# Altium footprint library Stargazer PCB.PcbLib: 32 footprints (part 1 of 2)
Each footprint in its own frame and in the unit in brackets; x right, y up, seen from the top. Pads: shape width x height; smd on the part's side, far side on the other; paste and mask are expansions set on the pad; w line width, h text height; cw(c..) or ccw(c..) is an arc to the next point about the centre after c.
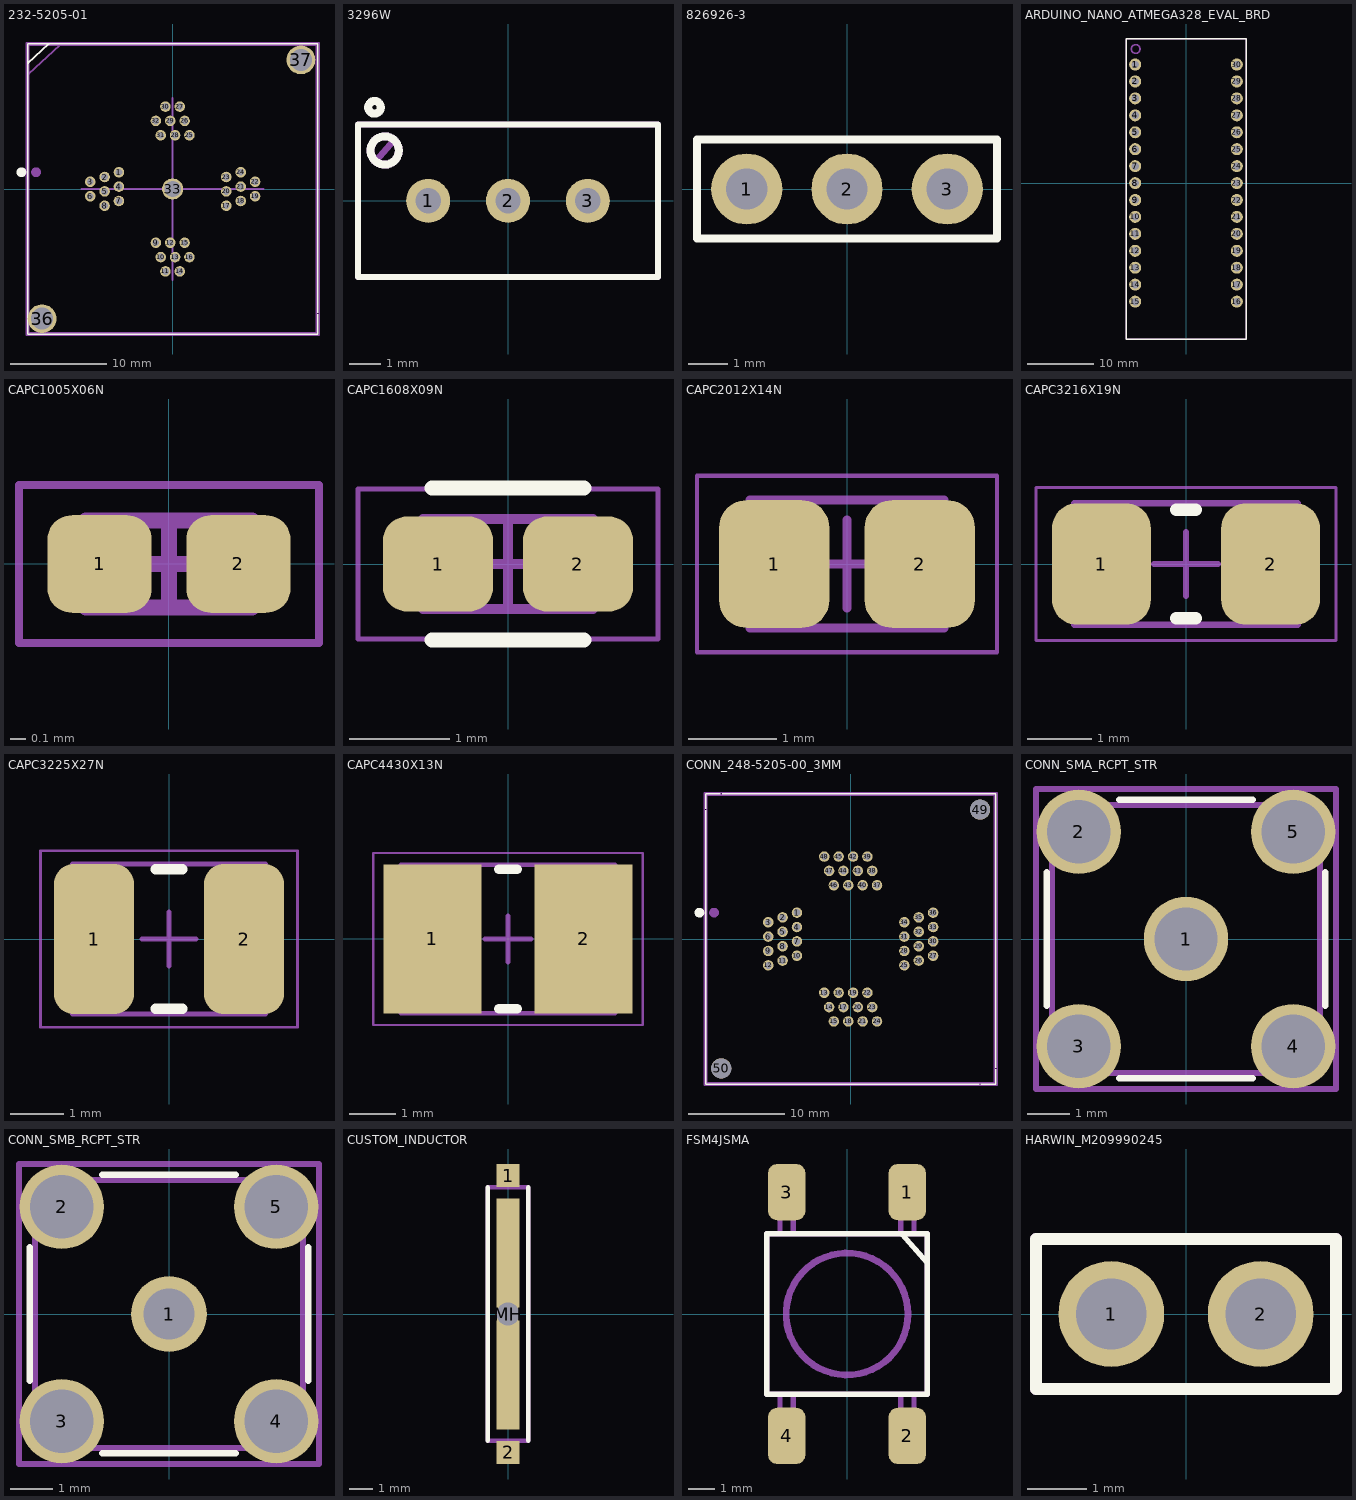
[diagram p0: the footprints below, top view; thin cyan lines are the x and y axes]

## 232-5205-01 [mm]
height 1.75
pads (35):
  round 1.1 hole 0.7 paste-2539.97: 1(-5.6,1.751) 2(-7.1,1.251) 3(-8.6,0.751) 4(-5.6,0.25) 5(-7.1,-0.25) 6(-8.6,-0.751) 7(-5.6,-1.251) 8(-7.1,-1.751) 9(-1.751,-5.6) 10(-1.251,-7.1) 11(-0.751,-8.6) 12(-0.25,-5.6) 13(0.25,-7.1) 14(0.751,-8.6) 15(1.251,-5.6) 16(1.751,-7.1) 17(5.6,-1.751) 18(7.1,-1.251) 19(8.6,-0.751) 20(5.6,-0.25) 21(7.1,0.25) 22(8.6,0.751) 23(5.6,1.251) 24(7.1,1.751) 25(1.751,5.6) 26(1.251,7.1) 27(0.751,8.6) 28(0.25,5.6) 29(-0.25,7.1) 30(-0.751,8.6) 31(-1.251,5.6) 32(-1.751,7.1)
  round 2.2 hole 1.7 paste-2539.97: 33(0,0)
  round 3 hole 2.3 paste-2539.97: 36(-13.622,-13.53) 37(13.378,13.47)
Top Overlay:
  circle w0.508: c-15.773,1.751 r0.254
  lines w0.15: -13.089,15.138 -12.911,15.138
  lines w0.152: -13.089,15.138 -15.138,15.138 -15.138,-15.138 15.138,-15.138 15.138,-13.089 ; -12.911,15.138 15.138,15.138 15.138,-12.911
  lines w0.2: -15.1,13.1 -12.911,15.138
Mechanical 13:
  circle w0.508: c-14.249,1.751 r0.254
  lines w0.2: -15,12 -11.8,15 ; -15.011,-15.011 15.011,-15.011 15.011,15.011 -15.011,15.011 -15.011,-15.011
  text ".Designator" at -6.7,-12.253 h3
Mechanical 15:
  lines w0.152: -15.265,-15.265 15.265,-15.265 15.265,15.265 -15.265,15.265 -15.265,-15.265
  lines w0.2: -9.5,0 0,0 ; 0,-9.5 0,0 ; 0,9.5 0,0 ; 9.5,0 0,0
3D body "232-5205-01_step.stp": height 16.75, standoff -5.15, extent -15,-15 15,15

## 3296W [mm]
height 1.75
pads (3):
  round 1.4 hole 0.8: 1(-2.54,0) 2(0,0) 3(2.54,0)
Top Overlay:
  circle w0.254: c-3.925,1.6 r0.451
  lines w0.2: -4.775,-2.425 4.775,-2.425 4.775,2.425 -4.775,2.425 -4.775,-2.425
  lines w0.254: -4.053,3.008 ccw(c-4.25,2.975) -4.05,2.975
Mechanical 13:
  circle w0.254: c-3.925,1.6 r0.45
  lines w0.2: -4.2,1.275 -3.625,1.925 ; -4.775,-2.425 4.775,-2.425 4.775,2.425 -4.775,2.425 -4.775,-2.425
  text ".Designator" at -4.05,-1.727 h2
3D body "3296W-1-203LF.step": height 11.55, standoff -7.72, extent -4.765,-2.41 4.765,2.42

## 826926-3 [mm]
height 1.75
pads (3):
  round 1.8 hole 1.05 paste-2539.97: 1(-2.54,0) 2(0,0) 3(2.54,0)
Top Overlay:
  lines w0.2: -3.8,-1.25 -3.8,1.25 3.8,1.25 3.8,-1.25 -3.8,-1.25
Mechanical 13:
  lines w0.1: -3.8,-1.25 -3.8,1.25 3.8,1.25 3.8,-1.25 -3.8,-1.25
  text ".Designator" at -2.925,-0.952 h1.5
3D body "c-0826926-03-o-3d.stp": height 9.5, standoff -3.2, extent -3.81,-1.25 3.81,1.25

## ARDUINO_NANO_ATMEGA328_EVAL_BRD [mm]
pads (30):
  round 1.8 hole 1.1: 1(-7.62,17.78) 2(-7.62,15.24) 3(-7.62,12.7) 4(-7.62,10.16) 5(-7.62,7.62) 6(-7.62,5.08) 7(-7.62,2.54) 8(-7.62,0) 9(-7.62,-2.54) 10(-7.62,-5.08) 11(-7.62,-7.62) 12(-7.62,-10.16) 13(-7.62,-12.7) 14(-7.62,-15.24) 15(-7.62,-17.78) 16(7.62,-17.78) 17(7.62,-15.24) 18(7.62,-12.7) 19(7.62,-10.16) 20(7.62,-7.62) 21(7.62,-5.08) 22(7.62,-2.54) 23(7.62,0) 24(7.62,2.54) 25(7.62,5.08) 26(7.62,7.62) 27(7.62,10.16) 28(7.62,12.7) 29(7.62,15.24) 30(7.62,17.78)
Top Overlay:
  lines w0.2: -9,-23.39 -9,21.61 9,21.61 9,-23.39 -9,-23.39
Mechanical 13:
  circle w0.254: c-7.55,20.11 r0.652
  lines w0.2: -9,-23.39 -9,21.61 9,21.61 9,-23.39 -9,-23.39
  text ".Designator" at -0.447,-7.62 h3
3D body "A000005.step": height 12.6, standoff -6, extent -9,-23.4 9,21.6

## CAPC1005X06N [mm] "Chip Capacitor, 2-Leads, Body 1.00x0.50mm, IPC Medium Density"
height 0.55
pads (2):
  rrect50% 0.66x0.62 smd mask+0.05: 1(-0.44,0) 2(0.44,0)
Mechanical 13:
  lines w0.1: -0.525,-0.275 0.525,-0.275 0.525,0.275 -0.525,0.275 -0.525,-0.275
  text ".Designator" at -1.2,0.449 h1
Mechanical 15:
  lines w0.05: -0.95,-0.5 0.95,-0.5 0.95,0.5 -0.95,0.5 -0.95,-0.5
  lines w0.1: -0.275,0 0.275,0 ; 0,-0.275 0,0.275
3D body "CAPC1005X06N.step": height 0.55, standoff 0, extent -0.525,-0.275 0.525,0.275

## CAPC1608X09N [mm] "Chip Capacitor, 2-Leads, Body 1.60x0.80mm, IPC Medium Density"
height 0.9
pads (2):
  rrect50% 1.1x0.95 smd: 1(-0.7,0) 2(0.7,0)
Top Overlay:
  lines w0.15: -0.762,-0.762 0.762,-0.762 ; -0.762,0.762 0.762,0.762
Mechanical 13:
  lines w0.1: -0.85,-0.45 0.85,-0.45 0.85,0.45 -0.85,0.45 -0.85,-0.45
  text ".Designator" at -0.85,-0.301 h1
Mechanical 15:
  lines w0.05: -1.5,-0.75 1.5,-0.75 1.5,0.75 -1.5,0.75 -1.5,-0.75
  lines w0.1: -0.45,0 0.45,0 ; 0,-0.45 0,0.45
3D body "CAPC1608X09N.step": height 0.9, standoff 0, extent -0.85,-0.45 0.85,0.45

## CAPC2012X14N [mm] "Chip Capacitor, 2-Leads, Body 2.00x1.25mm, IPC Medium Density"
height 1.45
pads (2):
  rrect50% 1.25x1.45 smd: 1(-0.825,0) 2(0.825,0)
Mechanical 13:
  lines w0.1: -1.1,-0.725 1.1,-0.725 1.1,0.725 -1.1,0.725 -1.1,-0.725
  text ".Designator" at -1.143,-0.285 h1.5
Mechanical 15:
  lines w0.05: -1.7,-1 1.7,-1 1.7,1 -1.7,1 -1.7,-1
  lines w0.1: -0.5,0 0.5,0 ; 0,-0.5 0,0.5
3D body "CAPC2012X14N.step": height 1.45, standoff 0, extent -1.1,-0.725 1.1,0.725

## CAPC3216X19N [mm]
height 1.75
pads (2):
  rrect50% 1.55x1.9 smd: 1(-1.325,0) 2(1.325,0)
Top Overlay:
  lines w0.2: -0.15,-0.85 0.15,-0.85 ; -0.15,0.85 0.15,0.85
Mechanical 13:
  lines w0.1: -1.75,-0.95 1.75,-0.95 1.75,0.95 -1.75,0.95 -1.75,-0.95
  text ".Designator" at -1.778,-0.285 h1.5
Mechanical 15:
  lines w0.05: -2.35,-1.2 2.35,-1.2 2.35,1.2 -2.35,1.2 -2.35,-1.2
  lines w0.1: -0.5,0 0.5,0 ; 0,-0.5 0,0.5
3D body "CAPC3216X19N.step": height 1.9, standoff 0, extent -1.75,-0.95 1.75,0.95

## CAPC3225X27N [mm] "Chip Capacitor, 2-Leads, Body 3.20x2.50mm, IPC Medium Density"
height 2.7
pads (2):
  rrect50% 1.5x2.8 smd: 1(-1.4,0) 2(1.4,0)
Top Overlay:
  lines w0.2: -0.25,-1.3 0.25,-1.3 ; -0.25,1.3 0.25,1.3
Mechanical 13:
  lines w0.1: -1.8,-1.4 -1.8,1.4 1.8,1.4 1.8,-1.4 -1.8,-1.4
  text ".Designator" at -1.524,-0.285 h1.5
Mechanical 15:
  lines w0.05: -2.4,-1.65 -2.4,1.65 2.4,1.65 2.4,-1.65 -2.4,-1.65
  lines w0.1: -0.5,0 0.5,0 ; 0,-0.5 0,0.5
3D body "CAPC3225X27N.step": height 2.7, standoff 0, extent -1.8,-1.4 1.8,1.4

## CAPC4430X13N [mm] "Chip Capacitor, 2-Leads, Body 4.40x3.00mm, IPC Medium Density"
height 1.3
pads (2):
  rect 2.1x3.2 smd: 1(-1.625,0) 2(1.625,0)
Top Overlay:
  lines w0.2: -0.2,-1.5 0.2,-1.5 ; -0.2,1.5 0.2,1.5
Mechanical 13:
  lines w0.1: -2.3,-1.6 -2.3,1.6 2.3,1.6 2.3,-1.6 -2.3,-1.6
  text ".Designator" at -2.1,-0.252 h1.5
Mechanical 15:
  lines w0.05: -2.9,-1.85 -2.9,1.85 2.9,1.85 2.9,-1.85 -2.9,-1.85
  lines w0.1: -0.5,0 0.5,0 ; 0,-0.5 0,0.5
3D body "CAPC4430X13N.step": height 1.3, standoff 0, extent -2.3,-1.6 2.3,1.6

## CONN_248-5205-00_3MM [mil]
pads (50):
  round 43 / inner round 60 / far side round 43 hole 28 paste-99999 mask+0: 1(-220.47,108.27) 2(-279.53,88.58) 3(-338.58,68.9) 4(-220.47,49.21) 5(-279.53,29.53) 6(-338.58,9.84) 7(-220.47,-9.84) 8(-279.53,-29.53) 9(-338.58,-49.21) 10(-220.47,-68.9) 11(-279.53,-88.58) 12(-338.58,-108.27) 13(-108.27,-220.47) 14(-88.58,-279.53) 15(-68.9,-338.58) 16(-49.21,-220.47) 17(-29.53,-279.53) 18(-9.84,-338.58) 19(9.84,-220.47) 20(29.53,-279.53) 21(49.21,-338.58) 22(68.9,-220.47) 23(88.58,-279.53) 24(108.27,-338.58) 25(220.47,-108.27) 26(279.53,-88.58) 27(338.58,-68.9) 28(220.47,-49.21) 29(279.53,-29.53) 30(338.58,-9.84) 31(220.47,9.84) 32(279.53,29.53) 33(338.58,49.21) 34(220.47,68.9) 35(279.53,88.58) 36(338.58,108.27) 37(108.27,220.47) 38(88.58,279.53) 39(68.9,338.58) 40(49.21,220.47) 41(29.53,279.53) 42(9.84,338.58) 43(-9.84,220.47) 44(-29.53,279.53) 45(-49.21,338.58) 46(-68.9,220.47) 47(-88.58,279.53) 48(-108.27,338.58)
  round 82.68 hole 82.68 unplated paste-99999 mask-51.5: 49(531.5,531.5) 50(-531.5,-531.5)
Top Overlay:
  circle w20: c-621,108.27 r10
  lines w6: -596,527.98 -596,-596 527.91,-596 ; -596,535.02 -596,596 -535.02,596 ; -527.98,596 596,596 596,-527.9 ; 535.09,-596 596,-596 596,-535.09
Mechanical 13:
  circle w20: c-561,108.27 r10
  lines w7.87: -591,-591 591,-591 591,591 -591,591 -591,-591
Mechanical 15:
  lines w6: -601,-601 601,-601 601,601 -601,601 -601,-601

## CONN_SMA_RCPT_STR [mm]
height 11.6
pads (5):
  round 2 hole 1.5 paste-2539.97: 1(0,0) 2(-2.54,2.54) 3(-2.54,-2.54) 4(2.54,-2.54) 5(2.54,2.54)
Top Overlay:
  lines w0.152: -3.302,-1.585 -3.302,1.585 ; -1.585,-3.302 1.585,-3.302 ; -1.585,3.302 1.585,3.302 ; 3.302,-1.585 3.302,1.585
Mechanical 13:
  lines w0.15: -3.175,-3.175 3.175,-3.175 3.175,3.175 -3.175,3.175 -3.175,-3.175
  text ".Designator" at -3.048,0.604 h1.5
Mechanical 15:
  lines w0.152: -3.556,-3.556 -3.556,3.556 3.556,3.556 3.556,-3.556 -3.556,-3.556
3D body "0733910060.step": height 9.5, standoff -4.13, extent -3.174,-3.175 3.174,3.175

## CONN_SMB_RCPT_STR [mm]
height 1.75
pads (5):
  round 1.8 hole 1.2 paste-2539.97: 1(0,0)
  round 2 hole 1.5 paste-2539.97: 2(-2.54,2.54) 3(-2.54,-2.54) 4(2.54,-2.54) 5(2.54,2.54)
Top Overlay:
  lines w0.152: -3.302,-1.585 -3.302,1.585 ; -1.585,-3.302 1.585,-3.302 ; -1.585,3.302 1.585,3.302 ; 3.302,-1.585 3.302,1.585
Mechanical 13:
  lines w0.15: -3.175,-3.175 -3.175,3.175 3.175,3.175 3.175,-3.175 -3.175,-3.175
  text ".Designator" at -3.048,0.604 h1.5
Mechanical 15:
  lines w0.152: -3.556,-3.556 3.556,-3.556 3.556,3.556 -3.556,3.556 -3.556,-3.556
3D body "c-413990-1-j-3d.stp": height 7.65, standoff -3.91, extent -3.175,-3.175 3.175,3.175

## CUSTOM_INDUCTOR [mm]
pads (3):
  rect 1x1 smd: 1(0,6) 2(0,-6)
  rect 1x10 hole 1 square unplated: MH(0,0)
Top Overlay:
  lines w0.2: -0.875,-5.5 -0.875,5.5 ; 0.875,-5.5 0.875,5.5
Mechanical 13:
  lines w0.2: -0.875,-5.5 0.875,-5.5 0.875,5.5 -0.875,5.5 -0.875,-5.5
  text ".Designator" at 1.852,-3.425 h1.5

## FSM4JSMA [mm]
height 1.75
pads (4):
  rrect50% 1.4x2.1 smd: 1(2.25,4.55) 2(2.25,-4.55) 3(-2.25,4.55) 4(-2.25,-4.55)
Top Overlay:
  lines w0.2: 2.05,2.975 3,1.9 ; -3,-3 3,-3 3,3 -3,3 -3,-3
Mechanical 13:
  circle w0.254: c0,0 r2.275
  lines w0.2: -2.5,-3 -2.5,-4.5 -2,-4.5 -2,-3 ; -2.5,3 -2.5,4.5 -2,4.5 -2,3 ; 2,-3 2,-4.5 2.5,-4.5 2.5,-3 ; 2,3 2,4.5 2.5,4.5 2.5,3 ; -3,-3 3,-3 3,3 -3,3 -3,-3
  text ".Designator" at 0.402,-3.775 h2
3D body "c-4-1437565-1-v1-3d.stp": height 5, standoff 0, extent -3,-5 3,5

## HARWIN_M209990245 [mm]
pads (2):
  round 1.8 hole 1.2: 1(-1.27,0) 2(1.27,0)
Top Overlay:
  lines w0.2: -2.55,-1.275 2.55,-1.275 2.55,1.275 -2.55,1.275 -2.55,-1.275
Mechanical 13:
  lines w0.2: -2.55,-1.275 2.55,-1.275 2.55,1.275 -2.55,1.275 -2.55,-1.275
  text ".Designator" at -2.3,-0.377 h2
3D body "M20-9990245.step": height 8.74, standoff -3, extent -2.54,-1.27 2.54,1.27